# Altium footprint library std-smt.PcbLib: 117 footprints (part 3 of 8)
Each footprint in its own frame and in the unit in brackets; x right, y up, seen from the top. Pads: shape width x height; smd on the part's side, far side on the other; paste and mask are expansions set on the pad; w line width, h text height; cw(c..) or ccw(c..) is an arc to the next point about the centre after c.
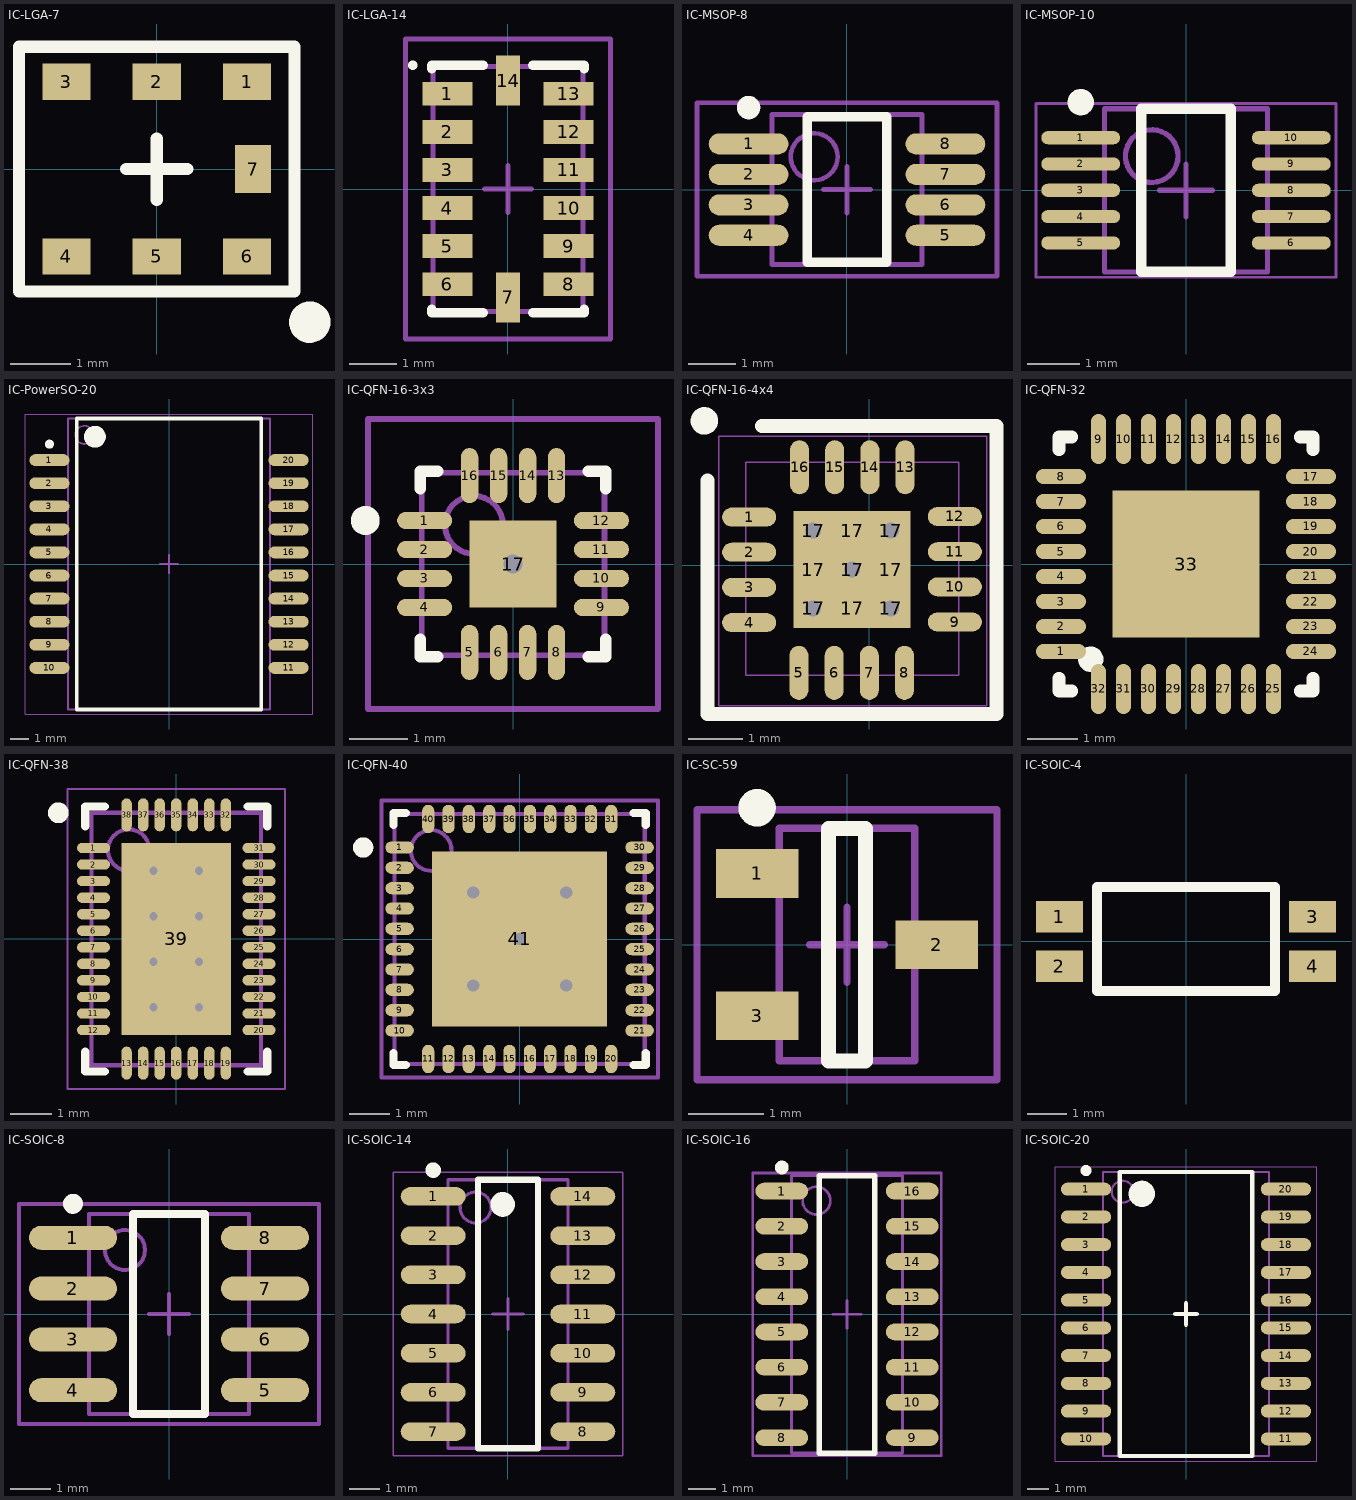
[diagram p2: the footprints below, top view; thin cyan lines are the x and y axes]

## IC-LGA-7 [mm] "LGA package, 7 pins"
height 0.73
pads (7):
  rect 0.8x0.6 smd: 1(1.5,1.45) 2(0,1.45) 3(-1.5,1.45) 4(-1.5,-1.45) 5(0,-1.45) 6(1.5,-1.45)
  rect 0.6x0.8 smd: 7(1.6,0)
Top Overlay:
  circle w0.381: c2.54,-2.54 r0.152
  lines w0.203: -0.508,0 0.508,0 ; 0,-0.508 0,0.508 ; -2.286,-2.032 -2.286,2.032 2.286,2.032 2.286,-2.032 -2.286,-2.032
3D body: height 0.98, standoff 0, extent -1.9,-1.8 1.9,1.8

## IC-LGA-14 [mm] "LGA, 14-Leads, Body 3x5x0.92mm, Pitch 0.8mm, IPC Medium Density"
height 1
pads (14):
  rect 1.05x0.5 smd: 1(-1.275,2) 2(-1.275,1.2) 3(-1.275,0.4) 4(-1.275,-0.4) 5(-1.275,-1.2) 6(-1.275,-2) 8(1.275,-2) 9(1.275,-1.2) 10(1.275,-0.4) 11(1.275,0.4) 12(1.275,1.2) 13(1.275,2)
  rect 0.5x1.05 smd: 7(0,-2.275) 14(0,2.275)
Top Overlay:
  circle w0.1: c-2,2.6 r0.05
  lines w0.2: -1.6,-2.525 -1.6,-2.6 -0.525,-2.6 ; -1.6,2.525 -1.6,2.6 -0.525,2.6 ; 0.525,-2.6 1.6,-2.6 1.6,-2.525 ; 0.525,2.6 1.6,2.6 1.6,2.525
Mechanical 13:
  lines w0.1: -1.575,-2.575 -1.575,2.575 1.575,2.575 1.575,-2.575 -1.575,-2.575
Mechanical 15:
  lines w0.1: -0.5,0 0.5,0 ; 0,-0.5 0,0.5 ; -2.15,-3.15 -2.15,3.15 2.15,3.15 2.15,-3.15 -2.15,-3.15
3D body: height 1.03, standoff -0.4, extent -1.506,-2.468 1.494,2.532

## IC-MSOP-8 [mm] "TSOP, 8-Leads, Body 3x3mm, Pitch 0.65mm"
height 1.1
pads (8):
  oval 1.7x0.45 smd: 1(-2.1,0.975) 2(-2.1,0.325) 3(-2.1,-0.325) 4(-2.1,-0.975) 5(2.1,-0.975) 6(2.1,-0.325) 7(2.1,0.325) 8(2.1,0.975)
Top Overlay:
  circle w0.25: c-2.1,1.75 r0.125
  lines w0.2: -0.85,-1.55 -0.85,1.55 0.85,1.55 0.85,-1.55 -0.85,-1.55
Mechanical 13:
  circle w0.1: c-0.7,0.7 r0.5
  lines w0.1: -1.6,-1.6 -1.6,1.6 1.6,1.6 1.6,-1.6 -1.6,-1.6
Mechanical 15:
  lines w0.1: -0.5,0 0.5,0 ; 0,-0.5 0,0.5 ; -3.2,-1.85 -3.2,1.85 3.2,1.85 3.2,-1.85 -3.2,-1.85
3D body: height 1.15, standoff 0, extent -2.45,-1.5 2.45,1.5

## IC-MSOP-10 [mm] "SOP, 10-Leads, Body 3.1x3.1mm, Pitch 0.5mm, IPC High Density"
height 1.1
pads (10):
  oval 1.5x0.25 smd: 1(-2,1) 2(-2,0.5) 3(-2,0) 4(-2,-0.5) 5(-2,-1) 6(2,-1) 7(2,-0.5) 8(2,0) 9(2,0.5) 10(2,1)
Top Overlay:
  circle w0.25: c-2,1.675 r0.125
  lines w0.2: -0.85,-1.55 -0.85,1.55 0.85,1.55 0.85,-1.55 -0.85,-1.55
Mechanical 13:
  circle w0.1: c-0.65,0.65 r0.5
  lines w0.1: -1.55,-1.55 -1.55,1.55 1.55,1.55 1.55,-1.55 -1.55,-1.55
Mechanical 15:
  lines w0.05: -2.85,-1.65 -2.85,1.65 2.85,1.65 2.85,-1.65 -2.85,-1.65
  lines w0.1: -0.5,0 0.5,0 ; 0,-0.5 0,0.5
3D body: height 1.05, standoff 0, extent -2.514,-1.5 2.514,1.5

## IC-PowerSO-20 [mm] "PowerSO-20 package, SOIC variant, 50 mil pitch"
height 3.6
pads (20):
  oval 2.2x0.65 smd: 1(-6.575,5.715) 2(-6.575,4.445) 3(-6.575,3.175) 4(-6.575,1.905) 5(-6.575,0.635) 6(-6.575,-0.635) 7(-6.575,-1.905) 8(-6.575,-3.175) 9(-6.575,-4.445) 10(-6.575,-5.715) 11(6.575,-5.715) 12(6.575,-4.445) 13(6.575,-3.175) 14(6.575,-1.905) 15(6.575,-0.635) 16(6.575,0.635) 17(6.575,1.905) 18(6.575,3.175) 19(6.575,4.445) 20(6.575,5.715)
Top Overlay:
  circle w0.6: c-4.075,7 r0.3
  circle w0.25: c-6.575,6.59 r0.125
  lines w0.2: -5.075,-8 5.075,-8 5.075,8 -5.075,8 -5.075,-8
Mechanical 13:
  circle w0.1: c-4.65,7.1 r0.5
  lines w0.1: -5.55,-8 5.55,-8 5.55,8 -5.55,8 -5.55,-8
Mechanical 15:
  lines w0.05: -7.9,-8.25 7.9,-8.25 7.9,8.25 -7.9,8.25 -7.9,-8.25
  lines w0.1: -0.5,0 0.5,0 ; 0,-0.5 0,0.5
3D body: height 3.6, standoff 0, extent -7.2,-8 7.2,8

## IC-QFN-16-3x3 [mm] "QFN, 16-Leads, Body 3x3mm, Pitch 0.5mm, IPC Low Density"
height 0.8
pads (17):
  oval 0.95x0.3 smd: 1(-1.525,0.75) 2(-1.525,0.25) 3(-1.525,-0.25) 4(-1.525,-0.75) 9(1.525,-0.75) 10(1.525,-0.25) 11(1.525,0.25) 12(1.525,0.75)
  oval 0.3x0.95 smd: 5(-0.75,-1.525) 6(-0.25,-1.525) 7(0.25,-1.525) 8(0.75,-1.525) 13(0.75,1.525) 14(0.25,1.525) 15(-0.25,1.525) 16(-0.75,1.525)
  rect 1.5x1.5 smd: 17(0,0)
via 0,0 diameter 0.66 hole 0.33
Top Overlay:
  circle w0.25: c-2.55,0.75 r0.125
  lines w0.2: -1.6,-1.3 -1.6,-1.6 -1.3,-1.6 ; -1.6,1.3 -1.6,1.6 -1.3,1.6 ; 1.3,-1.6 1.6,-1.6 1.6,-1.3 ; 1.3,1.6 1.6,1.6 1.6,1.3
Mechanical 13:
  circle w0.1: c-0.675,0.675 r0.5
  lines w0.1: -1.575,-1.575 1.575,-1.575 1.575,1.575 -1.575,1.575 -1.575,-1.575
Mechanical 15:
  lines w0.1: -0.5,0 0.5,0 ; 0,-0.5 0,0.5 ; -2.5,-2.5 2.5,-2.5 2.5,2.5 -2.5,2.5 -2.5,-2.5
3D body: height 0.9, standoff 0, extent -1.501,-1.501 1.501,1.501

## IC-QFN-16-4x4 [mm] "QFN-16, 4x4 mm leadless"
height 0.102
pads (25):
  oval 1x0.35 smd paste+0.001 mask+0.14: 1(-2.22,0.89) 2(-2.22,0.24) 3(-2.22,-0.41) 4(-2.22,-1.06) 9(1.58,-1.05) 10(1.58,-0.4) 11(1.58,0.25) 12(1.58,0.9)
  oval 0.35x1 smd paste+0.001 mask+0.14: 5(-1.3,-1.99) 6(-0.65,-1.99) 7(0,-1.99) 8(0.65,-1.99) 13(0.66,1.81) 14(0.01,1.81) 15(-0.64,1.81) 16(-1.29,1.81)
  rect 0.72x0.72 hole 0.3 paste+0 mask+0.14: 17(-1.04,-0.8) 17(-1.04,0.64) 17(-0.32,-0.08) 17(0.4,-0.8) 17(0.4,0.64)
  rect 0.72x0.72 smd paste-0.72 mask+0.14: 17(-1.04,-0.08) 17(-0.32,-0.8) 17(-0.32,0.64) 17(0.4,-0.08)
Top Overlay:
  circle w0.254: c-3.048,2.667 r0.127
  lines w0.254: -2.99,1.57 -2.99,-2.75 2.35,-2.75 2.35,2.57 -1.99,2.57
Top Paste:
  region: -0.17,-1.13 0.73,-1.13 0.73,-0.23 -0.17,-0.23
  region: -0.17,0.07 0.73,0.07 0.73,0.97 -0.17,0.97
  region: -1.37,0.07 -0.47,0.07 -0.47,0.97 -1.37,0.97
  region: -1.37,-1.13 -0.47,-1.13 -0.47,-0.23 -1.37,-0.23
Mechanical 1:
  lines w0.025: -3,1.57 -3,-2.75 2.34,-2.75 2.34,2.57 -1.99,2.57
Mechanical 13:
  lines w0.025: -2.286,-2.032 1.651,-2.032 1.651,1.905 -2.286,1.905 -2.286,-2.032
Mechanical 15:
  lines w0.025: -2.782,-2.601 -2.782,2.382 2.168,2.382 2.168,-2.601 -2.782,-2.601
3D body: height 0.92, standoff 0, extent -2.32,-2.08 1.68,1.92

## IC-QFN-32 [mm] "QFN-32"
height 0.8
pads (33):
  oval 1x0.3 smd: 1(-2.5,-1.75) 2(-2.5,-1.25) 3(-2.5,-0.75) 4(-2.5,-0.25) 5(-2.5,0.25) 6(-2.5,0.75) 7(-2.5,1.25) 8(-2.5,1.75) 17(2.5,1.75) 18(2.5,1.25) 19(2.5,0.75) 20(2.5,0.25) 21(2.5,-0.25) 22(2.5,-0.75) 23(2.5,-1.25) 24(2.5,-1.75)
  oval 0.3x1 smd: 9(-1.75,2.5) 10(-1.25,2.5) 11(-0.75,2.5) 12(-0.25,2.5) 13(0.25,2.5) 14(0.75,2.5) 15(1.25,2.5) 16(1.75,2.5) 25(1.75,-2.5) 26(1.25,-2.5) 27(0.75,-2.5) 28(0.25,-2.5) 29(-0.25,-2.5) 30(-0.75,-2.5) 31(-1.25,-2.5) 32(-1.75,-2.5)
  rect 2.95x2.95 smd: 33(0,0)
Top Overlay:
  circle w0.254: c-1.905,-1.905 r0.127
  lines w0.254: -2.54,-2.286 -2.54,-2.54 -2.286,-2.54 ; -2.54,2.286 -2.54,2.54 -2.286,2.54 ; 2.286,-2.54 2.54,-2.54 2.54,-2.286 ; 2.286,2.54 2.54,2.54 2.54,2.286
3D body: height 0.87, standoff -0.13, extent -2.5,-2.5 2.5,2.5

## IC-QFN-38 [mm] "QFN, 38-Leads, Body 6.1x4.1mm, Pitch 0.4mm, Thermal Pad 2.65x4.65mm, IPC Medium Density"
height 0.8
pads (39):
  oval 0.8x0.25 smd: 1(-2,2.2) 2(-2,1.8) 3(-2,1.4) 4(-2,1) 5(-2,0.6) 6(-2,0.2) 7(-2,-0.2) 8(-2,-0.6) 9(-2,-1) 10(-2,-1.4) 11(-2,-1.8) 12(-2,-2.2) 20(2,-2.2) 21(2,-1.8) 22(2,-1.4) 23(2,-1) 24(2,-0.6) 25(2,-0.2) 26(2,0.2) 27(2,0.6) 28(2,1) 29(2,1.4) 30(2,1.8) 31(2,2.2)
  oval 0.25x0.8 smd: 13(-1.2,-3) 14(-0.8,-3) 15(-0.4,-3) 16(0,-3) 17(0.4,-3) 18(0.8,-3) 19(1.2,-3) 32(1.2,3) 33(0.8,3) 34(0.4,3) 35(0,3) 36(-0.4,3) 37(-0.8,3) 38(-1.2,3)
  rect 2.65x4.65 smd: 39(0,0)
via -0.55,1.65 diameter 0.5 hole 0.2
via 0.55,1.65 diameter 0.5 hole 0.2
via -0.55,0.55 diameter 0.5 hole 0.2
via 0.55,0.55 diameter 0.5 hole 0.2
via -0.55,-0.55 diameter 0.5 hole 0.2
via 0.55,-0.55 diameter 0.5 hole 0.2
via -0.55,-1.65 diameter 0.5 hole 0.2
via 0.55,-1.65 diameter 0.5 hole 0.2
Top Overlay:
  circle w0.25: c-2.85,3.05 r0.125
  lines w0.2: -2.2,-2.725 -2.2,-3.2 -1.725,-3.2 ; -2.2,2.725 -2.2,3.2 -1.725,3.2 ; 1.725,-3.2 2.2,-3.2 2.2,-2.725 ; 1.725,3.2 2.2,3.2 2.2,2.725
Mechanical 13:
  circle w0.1: c-1.15,2.15 r0.5
  lines w0.1: -2.05,-3.05 -2.05,3.05 2.05,3.05 2.05,-3.05 -2.05,-3.05
Mechanical 15:
  lines w0.05: -2.625,-3.625 -2.625,3.625 2.625,3.625 2.625,-3.625 -2.625,-3.625
  lines w0.1: -0.5,0 0.5,0 ; 0,-0.5 0,0.5
3D body: height 0.76, standoff -0.05, extent -2.01,-3.01 2.01,3.01

## IC-QFN-40 [mm] "QFN, 40-Leads, Body 6x6mm, Pitch 0.5mm,"
height 1
pads (41):
  oval 0.7x0.3 smd: 1(-2.95,2.25) 2(-2.95,1.75) 3(-2.95,1.25) 4(-2.95,0.75) 5(-2.95,0.25) 6(-2.95,-0.25) 7(-2.95,-0.75) 8(-2.95,-1.25) 9(-2.95,-1.75) 10(-2.95,-2.25) 21(2.95,-2.25) 22(2.95,-1.75) 23(2.95,-1.25) 24(2.95,-0.75) 25(2.95,-0.25) 26(2.95,0.25) 27(2.95,0.75) 28(2.95,1.25) 29(2.95,1.75) 30(2.95,2.25)
  oval 0.3x0.7 smd: 11(-2.25,-2.95) 12(-1.75,-2.95) 13(-1.25,-2.95) 14(-0.75,-2.95) 15(-0.25,-2.95) 16(0.25,-2.95) 17(0.75,-2.95) 18(1.25,-2.95) 19(1.75,-2.95) 20(2.25,-2.95) 31(2.25,2.95) 32(1.75,2.95) 33(1.25,2.95) 34(0.75,2.95) 35(0.25,2.95) 36(-0.25,2.95) 37(-0.75,2.95) 38(-1.25,2.95) 39(-1.75,2.95) 40(-2.25,2.95)
  rect 4.3x4.3 smd: 41(0,0)
via -1.143,-1.143 diameter 0.7 hole 0.3
via 1.143,-1.143 diameter 0.7 hole 0.3
via -1.143,1.143 diameter 0.7 hole 0.3
via 1.143,1.143 diameter 0.7 hole 0.3
via 0,0 diameter 0.7 hole 0.3
Top Overlay:
  circle w0.25: c-3.85,2.25 r0.125
  lines w0.2: -3.1,-2.8 -3.1,-3.1 -2.8,-3.1 ; -3.1,2.8 -3.1,3.1 -2.8,3.1 ; 2.8,-3.1 3.1,-3.1 3.1,-2.8 ; 2.8,3.1 3.1,3.1 3.1,2.8
Mechanical 13:
  circle w0.1: c-2.175,2.175 r0.5
  lines w0.1: -3.075,-3.075 3.075,-3.075 3.075,3.075 -3.075,3.075 -3.075,-3.075
Mechanical 15:
  lines w0.1: -0.5,0 0.5,0 ; 0,-0.5 0,0.5 ; -3.4,-3.4 3.4,-3.4 3.4,3.4 -3.4,3.4 -3.4,-3.4
3D body: height 1.04, standoff -0.01, extent -3.075,-3.073 3.075,3.077

## IC-SC-59 [mm] "SC59, 3-Leads, Body 2.9x1.6mm, Pitch 0.95mm, Lead Span 2.7mm, IPC Medium Density"
height 1.5
pads (3):
  rect 1.1x0.65 smd: 1(-1.2,0.95) 2(1.2,0) 3(-1.2,-0.95)
Top Overlay:
  circle w0.25: c-1.2,1.825 r0.125
  lines w0.2: -0.25,-1.55 0.25,-1.55 0.25,1.55 -0.25,1.55 -0.25,-1.55
Mechanical 13:
  lines w0.1: -0.9,-1.55 -0.9,1.55 0.9,1.55 0.9,-1.55 -0.9,-1.55
Mechanical 15:
  lines w0.1: -0.5,0 0.5,0 ; 0,-0.5 0,0.5 ; -2,-1.8 -2,1.8 2,1.8 2,-1.8 -2,-1.8
3D body: height 1.25, standoff -0.15, extent -1.399,-1.5 1.4,1.5

## IC-SOIC-4 [mm] "Fototransistor, IRED, PC3H7J00000F  Series"
height 2
pads (4):
  rect 1.2x0.8 smd: 1(-3.25,0.635) 2(-3.25,-0.635) 3(3.25,0.635) 4(3.25,-0.635)
Top Overlay:
  lines w0.254: -2.286,-1.27 -2.286,-0.349 -2.286,0.984 -2.286,1.397 2.286,1.397 2.286,0.476 2.286,-0.349 2.286,-1.27 -2.286,-1.27
3D body: height 2.1, standoff -0.02, extent -3.5,-1.3 3.5,1.3

## IC-SOIC-8 [mm] "SOIC, 8-Leads, Body 4.9x3.8mm, Pitch 1.27mm, IPC Medium Density"
height 1.75
pads (8):
  oval 2.2x0.6 smd: 1(-2.4,1.905) 2(-2.4,0.635) 3(-2.4,-0.635) 4(-2.4,-1.905) 5(2.4,-1.905) 6(2.4,-0.635) 7(2.4,0.635) 8(2.4,1.905)
Top Overlay:
  circle w0.25: c-2.4,2.755 r0.125
  lines w0.2: -0.9,-2.5 0.9,-2.5 0.9,2.5 -0.9,2.5 -0.9,-2.5
Mechanical 13:
  circle w0.1: c-1.1,1.6 r0.5
  lines w0.1: -2,-2.5 2,-2.5 2,2.5 -2,2.5 -2,-2.5
Mechanical 15:
  lines w0.1: -0.5,0 0.5,0 ; 0,-0.5 0,0.5 ; -3.75,-2.75 3.75,-2.75 3.75,2.75 -3.75,2.75 -3.75,-2.75
3D body: height 1.75, standoff 0, extent -3,-2.45 3,2.45

## IC-SOIC-14 [mm] "SOIC, 14-Leads, Body 8,65x3,90mm, Pitch 1,27mm, IPC Medium Density"
height 1.75
pads (14):
  oval 2.1x0.6 smd: 1(-2.425,3.81) 2(-2.425,2.54) 3(-2.425,1.27) 4(-2.425,0) 5(-2.425,-1.27) 6(-2.425,-2.54) 7(-2.425,-3.81) 8(2.425,-3.81) 9(2.425,-2.54) 10(2.425,-1.27) 11(2.425,0) 12(2.425,1.27) 13(2.425,2.54) 14(2.425,3.81)
Top Overlay:
  circle w0.25: c-2.425,4.66 r0.125
  circle w0.4: c-0.175,3.55 r0.2
  lines w0.2: -0.975,-4.35 -0.975,4.35 0.975,4.35 0.975,-4.35 -0.975,-4.35
Mechanical 13:
  circle w0.1: c-1.05,3.45 r0.5
  lines w0.1: -1.95,-4.35 -1.95,4.35 1.95,4.35 1.95,-4.35 -1.95,-4.35
Mechanical 15:
  lines w0.05: -3.725,-4.6 -3.725,4.6 3.725,4.6 3.725,-4.6 -3.725,-4.6
  lines w0.1: -0.5,0 0.5,0 ; 0,-0.5 0,0.5
3D body: height 1.75, standoff 0, extent -3,-4.375 3,4.375

## IC-SOIC-16 [mm] "SOIC Narrow, 16-Leads, Body 9.9x3.9mm, Pitch 1.27mm"
height 1.91
pads (16):
  oval 1.9x0.6 smd: 1(-2.35,4.445) 2(-2.35,3.175) 3(-2.35,1.905) 4(-2.35,0.635) 5(-2.35,-0.635) 6(-2.35,-1.905) 7(-2.35,-3.175) 8(-2.35,-4.445) 9(2.35,-4.445) 10(2.35,-3.175) 11(2.35,-1.905) 12(2.35,-0.635) 13(2.35,0.635) 14(2.35,1.905) 15(2.35,3.175) 16(2.35,4.445)
Top Overlay:
  circle w0.25: c-2.35,5.295 r0.125
  lines w0.2: -1,-5 -1,5 1,5 1,-5 -1,-5
Mechanical 13:
  circle w0.1: c-1.1,4.1 r0.5
  lines w0.1: -2,-5 -2,5 2,5 2,-5 -2,-5
Mechanical 15:
  lines w0.1: -0.5,0 0.5,0 ; 0,-0.5 0,0.5 ; -3.4,-5.1 -3.4,5.1 3.4,5.1 3.4,-5.1 -3.4,-5.1
3D body: height 1.65, standoff 0, extent -3.04,-5 3.04,5

## IC-SOIC-20 [mm] "SOIC-20 package, 50 mil pitch"
height 2.65
pads (20):
  oval 2.3x0.6 smd: 1(-4.575,5.715) 2(-4.575,4.445) 3(-4.575,3.175) 4(-4.575,1.905) 5(-4.575,0.635) 6(-4.575,-0.635) 7(-4.575,-1.905) 8(-4.575,-3.175) 9(-4.575,-4.445) 10(-4.575,-5.715) 11(4.575,-5.715) 12(4.575,-4.445) 13(4.575,-3.175) 14(4.575,-1.905) 15(4.575,-0.635) 16(4.575,0.635) 17(4.575,1.905) 18(4.575,3.175) 19(4.575,4.445) 20(4.575,5.715)
Top Overlay:
  circle w0.25: c-4.575,6.565 r0.125
  circle w0.6: c-2.025,5.5 r0.3
  lines w0.2: -3.025,-6.5 -3.025,6.5 3.025,6.5 3.025,-6.5 -3.025,-6.5
  lines w0.203: -0.5,0 0.5,0 ; 0,-0.5 0,0.5
Mechanical 13:
  circle w0.1: c-2.9,5.6 r0.5
  lines w0.1: -3.8,-6.5 -3.8,6.5 3.8,6.5 3.8,-6.5 -3.8,-6.5
Mechanical 15:
  lines w0.05: -5.975,-6.75 -5.975,6.75 5.975,6.75 5.975,-6.75 -5.975,-6.75
  lines w0.1: -0.5,0 0.5,0 ; 0,-0.5 0,0.5
3D body: height 2.24, standoff 0, extent -5.067,-6.3 5.067,6.3